# Altium schematic symbol library Regulator_Linear.SchLib: 1452 symbols (part 8 of 10) (continued)
## TCR2EE10
designator *  value TCR2EE10
ki_keywords: TOSHIBA LDO voltage regulator; ki_description: 200mA Low-dropout Voltage Regulator, Vout 1.0V, Vin up to 5.5V, SOT-553; ki_fp_filters: SOT?553*; Footprint: Package_TO_SOT_SMD:SOT-553; Supplier: https://toshiba.semicon-storage.com/info/docget.jsp?did=13794&prodName=TCR2EF45
footprint SOT-553
pins: 1 CTRL (in), 2 GND (power), 3 VIN (power), 4 VOUT (power), 5 NC (in) hidden

## TCR2EE11
designator *  value TCR2EE11
ki_keywords: TOSHIBA LDO voltage regulator; ki_description: 200mA Low-dropout Voltage Regulator, Vout 1.1V, Vin up to 5.5V, SOT-553; ki_fp_filters: SOT?553*; Footprint: Package_TO_SOT_SMD:SOT-553; Supplier: https://toshiba.semicon-storage.com/info/docget.jsp?did=13794&prodName=TCR2EF45
footprint SOT-553
pins: 1 CTRL (in), 2 GND (power), 3 VIN (power), 4 VOUT (power), 5 NC (in) hidden

## TCR2EE12
designator *  value TCR2EE12
ki_keywords: TOSHIBA LDO voltage regulator; ki_description: 200mA Low-dropout Voltage Regulator, Vout 1.2V, Vin up to 5.5V, SOT-553; ki_fp_filters: SOT?553*; Footprint: Package_TO_SOT_SMD:SOT-553; Supplier: https://toshiba.semicon-storage.com/info/docget.jsp?did=13794&prodName=TCR2EF45
footprint SOT-553
pins: 1 CTRL (in), 2 GND (power), 3 VIN (power), 4 VOUT (power), 5 NC (in) hidden

## TCR2EE13
designator *  value TCR2EE13
ki_keywords: TOSHIBA LDO voltage regulator; ki_description: 200mA Low-dropout Voltage Regulator, Vout 1.3V, Vin up to 5.5V, SOT-553; ki_fp_filters: SOT?553*; Footprint: Package_TO_SOT_SMD:SOT-553; Supplier: https://toshiba.semicon-storage.com/info/docget.jsp?did=13794&prodName=TCR2EF45
footprint SOT-553
pins: 1 CTRL (in), 2 GND (power), 3 VIN (power), 4 VOUT (power), 5 NC (in) hidden

## TCR2EE14
designator *  value TCR2EE14
ki_keywords: TOSHIBA LDO voltage regulator; ki_description: 200mA Low-dropout Voltage Regulator, Vout 1.4V, Vin up to 5.5V, SOT-553; ki_fp_filters: SOT?553*; Footprint: Package_TO_SOT_SMD:SOT-553; Supplier: https://toshiba.semicon-storage.com/info/docget.jsp?did=13794&prodName=TCR2EF45
footprint SOT-553
pins: 1 CTRL (in), 2 GND (power), 3 VIN (power), 4 VOUT (power), 5 NC (in) hidden

## TCR2EE15
designator *  value TCR2EE15
ki_keywords: TOSHIBA LDO voltage regulator; ki_description: 200mA Low-dropout Voltage Regulator, Vout 1.5V, Vin up to 5.5V, SOT-553; ki_fp_filters: SOT?553*; Footprint: Package_TO_SOT_SMD:SOT-553; Supplier: https://toshiba.semicon-storage.com/info/docget.jsp?did=13794&prodName=TCR2EF45
footprint SOT-553
pins: 1 CTRL (in), 2 GND (power), 3 VIN (power), 4 VOUT (power), 5 NC (in) hidden

## TCR2EE17
designator *  value TCR2EE17
ki_keywords: TOSHIBA LDO voltage regulator; ki_description: 200mA Low-dropout Voltage Regulator, Vout 1.7V, Vin up to 5.5V, SOT-553; ki_fp_filters: SOT?553*; Footprint: Package_TO_SOT_SMD:SOT-553; Supplier: https://toshiba.semicon-storage.com/info/docget.jsp?did=13794&prodName=TCR2EF45
footprint SOT-553
pins: 1 CTRL (in), 2 GND (power), 3 VIN (power), 4 VOUT (power), 5 NC (in) hidden

## TCR2EE18
designator *  value TCR2EE18
ki_keywords: TOSHIBA LDO voltage regulator; ki_description: 200mA Low-dropout Voltage Regulator, Vout 1.8V, Vin up to 5.5V, SOT-553; ki_fp_filters: SOT?553*; Footprint: Package_TO_SOT_SMD:SOT-553; Supplier: https://toshiba.semicon-storage.com/info/docget.jsp?did=13794&prodName=TCR2EF45
footprint SOT-553
pins: 1 CTRL (in), 2 GND (power), 3 VIN (power), 4 VOUT (power), 5 NC (in) hidden

## TCR2EE19
designator *  value TCR2EE19
ki_keywords: TOSHIBA LDO voltage regulator; ki_description: 200mA Low-dropout Voltage Regulator, Vout 1.9V, Vin up to 5.5V, SOT-553; ki_fp_filters: SOT?553*; Footprint: Package_TO_SOT_SMD:SOT-553; Supplier: https://toshiba.semicon-storage.com/info/docget.jsp?did=13794&prodName=TCR2EF45
footprint SOT-553
pins: 1 CTRL (in), 2 GND (power), 3 VIN (power), 4 VOUT (power), 5 NC (in) hidden

## TCR2EE20
designator *  value TCR2EE20
ki_keywords: TOSHIBA LDO voltage regulator; ki_description: 200mA Low-dropout Voltage Regulator, Vout 2.0V, Vin up to 5.5V, SOT-553; ki_fp_filters: SOT?553*; Footprint: Package_TO_SOT_SMD:SOT-553; Supplier: https://toshiba.semicon-storage.com/info/docget.jsp?did=13794&prodName=TCR2EF45
footprint SOT-553
pins: 1 CTRL (in), 2 GND (power), 3 VIN (power), 4 VOUT (power), 5 NC (in) hidden

## TCR2EE24
designator *  value TCR2EE24
ki_keywords: TOSHIBA LDO voltage regulator; ki_description: 200mA Low-dropout Voltage Regulator, Vout 2.4V, Vin up to 5.5V, SOT-553; ki_fp_filters: SOT?553*; Footprint: Package_TO_SOT_SMD:SOT-553; Supplier: https://toshiba.semicon-storage.com/info/docget.jsp?did=13794&prodName=TCR2EF45
footprint SOT-553
pins: 1 CTRL (in), 2 GND (power), 3 VIN (power), 4 VOUT (power), 5 NC (in) hidden

## TCR2EE25
designator *  value TCR2EE25
ki_keywords: TOSHIBA LDO voltage regulator; ki_description: 200mA Low-dropout Voltage Regulator, Vout 2.5V, Vin up to 5.5V, SOT-553; ki_fp_filters: SOT?553*; Footprint: Package_TO_SOT_SMD:SOT-553; Supplier: https://toshiba.semicon-storage.com/info/docget.jsp?did=13794&prodName=TCR2EF45
footprint SOT-553
pins: 1 CTRL (in), 2 GND (power), 3 VIN (power), 4 VOUT (power), 5 NC (in) hidden

## TCR2EE27
designator *  value TCR2EE27
ki_keywords: TOSHIBA LDO voltage regulator; ki_description: 200mA Low-dropout Voltage Regulator, Vout 2.7V, Vin up to 5.5V, SOT-553; ki_fp_filters: SOT?553*; Footprint: Package_TO_SOT_SMD:SOT-553; Supplier: https://toshiba.semicon-storage.com/info/docget.jsp?did=13794&prodName=TCR2EF45
footprint SOT-553
pins: 1 CTRL (in), 2 GND (power), 3 VIN (power), 4 VOUT (power), 5 NC (in) hidden

## TCR2EE105
designator *  value TCR2EE105
ki_keywords: TOSHIBA LDO voltage regulator; ki_description: 200mA Low-dropout Voltage Regulator, Vout 1.05V, Vin up to 5.5V, SOT-553; ki_fp_filters: SOT?553*; Footprint: Package_TO_SOT_SMD:SOT-553; Supplier: https://toshiba.semicon-storage.com/info/docget.jsp?did=13794&prodName=TCR2EF45
footprint SOT-553
pins: 1 CTRL (in), 2 GND (power), 3 VIN (power), 4 VOUT (power), 5 NC (in) hidden

## TCR2EE115
designator *  value TCR2EE115
ki_keywords: TOSHIBA LDO voltage regulator; ki_description: 200mA Low-dropout Voltage Regulator, Vout 1.15V, Vin up to 5.5V, SOT-553; ki_fp_filters: SOT?553*; Footprint: Package_TO_SOT_SMD:SOT-553; Supplier: https://toshiba.semicon-storage.com/info/docget.jsp?did=13794&prodName=TCR2EF45
footprint SOT-553
pins: 1 CTRL (in), 2 GND (power), 3 VIN (power), 4 VOUT (power), 5 NC (in) hidden

## TCR2EE125
designator *  value TCR2EE125
ki_keywords: TOSHIBA LDO voltage regulator; ki_description: 200mA Low-dropout Voltage Regulator, Vout 1.25V, Vin up to 5.5V, SOT-553; ki_fp_filters: SOT?553*; Footprint: Package_TO_SOT_SMD:SOT-553; Supplier: https://toshiba.semicon-storage.com/info/docget.jsp?did=13794&prodName=TCR2EF45
footprint SOT-553
pins: 1 CTRL (in), 2 GND (power), 3 VIN (power), 4 VOUT (power), 5 NC (in) hidden

## TCR2EE135
designator *  value TCR2EE135
ki_keywords: TOSHIBA LDO voltage regulator; ki_description: 200mA Low-dropout Voltage Regulator, Vout 1.35V, Vin up to 5.5V, SOT-553; ki_fp_filters: SOT?553*; Footprint: Package_TO_SOT_SMD:SOT-553; Supplier: https://toshiba.semicon-storage.com/info/docget.jsp?did=13794&prodName=TCR2EF45
footprint SOT-553
pins: 1 CTRL (in), 2 GND (power), 3 VIN (power), 4 VOUT (power), 5 NC (in) hidden

## TCR2EE145
designator *  value TCR2EE145
ki_keywords: TOSHIBA LDO voltage regulator; ki_description: 200mA Low-dropout Voltage Regulator, Vout 1.45V, Vin up to 5.5V, SOT-553; ki_fp_filters: SOT?553*; Footprint: Package_TO_SOT_SMD:SOT-553; Supplier: https://toshiba.semicon-storage.com/info/docget.jsp?did=13794&prodName=TCR2EF45
footprint SOT-553
pins: 1 CTRL (in), 2 GND (power), 3 VIN (power), 4 VOUT (power), 5 NC (in) hidden

## TCR2EE185
designator *  value TCR2EE185
ki_keywords: TOSHIBA LDO voltage regulator; ki_description: 200mA Low-dropout Voltage Regulator, Vout 1.85V, Vin up to 5.5V, SOT-553; ki_fp_filters: SOT?553*; Footprint: Package_TO_SOT_SMD:SOT-553; Supplier: https://toshiba.semicon-storage.com/info/docget.jsp?did=13794&prodName=TCR2EF45
footprint SOT-553
pins: 1 CTRL (in), 2 GND (power), 3 VIN (power), 4 VOUT (power), 5 NC (in) hidden

## TCR2EE275
designator *  value TCR2EE275
ki_keywords: TOSHIBA LDO voltage regulator; ki_description: 200mA Low-dropout Voltage Regulator, Vout 2.75V, Vin up to 5.5V, SOT-553; ki_fp_filters: SOT?553*; Footprint: Package_TO_SOT_SMD:SOT-553; Supplier: https://toshiba.semicon-storage.com/info/docget.jsp?did=13794&prodName=TCR2EF45
footprint SOT-553
pins: 1 CTRL (in), 2 GND (power), 3 VIN (power), 4 VOUT (power), 5 NC (in) hidden

## TLV1117-15
designator *  value TLV1117-15
ki_keywords: linear regulator ldo fixed positive; ki_description: 800mA Low-Dropout Linear Regulator, 1.5V fixed output, TO-220/TO-252/TO-263/SOT-223; ki_fp_filters: SOT?223* TO?263* TO?252* TO?220*; Supplier: http://www.ti.com/lit/ds/symlink/tlv1117.pdf
pins: 1 GND (power), 2 VO (power), 3 VI (power)

## TLV1117-18
designator *  value TLV1117-18
ki_keywords: linear regulator ldo fixed positive; ki_description: 800mA Low-Dropout Linear Regulator, 1.8V fixed output, TO-220/TO-252/TO-263/SOT-223; ki_fp_filters: SOT?223* TO?263* TO?252* TO?220*; Supplier: http://www.ti.com/lit/ds/symlink/tlv1117.pdf
pins: 1 GND (power), 2 VO (power), 3 VI (power)

## TLV1117-25
designator *  value TLV1117-25
ki_keywords: linear regulator ldo fixed positive; ki_description: 800mA Low-Dropout Linear Regulator, 2.5V fixed output, TO-220/TO-252/TO-263/SOT-223; ki_fp_filters: SOT?223* TO?263* TO?252* TO?220*; Supplier: http://www.ti.com/lit/ds/symlink/tlv1117.pdf
pins: 1 GND (power), 2 VO (power), 3 VI (power)

## TLV1117-33
designator *  value TLV1117-33
ki_keywords: linear regulator ldo fixed positive; ki_description: 800mA Low-Dropout Linear Regulator, 3.3V fixed output, TO-220/TO-252/TO-263/SOT-223; ki_fp_filters: SOT?223* TO?263* TO?252* TO?220*; Supplier: http://www.ti.com/lit/ds/symlink/tlv1117.pdf
pins: 1 GND (power), 2 VO (power), 3 VI (power)

## TLV1117-50
designator *  value TLV1117-50
ki_keywords: linear regulator ldo fixed positive; ki_description: 800mA Low-Dropout Linear Regulator, 5.0V fixed output, TO-220/TO-252/TO-263/SOT-223; ki_fp_filters: SOT?223* TO?263* TO?252* TO?220*; Supplier: http://www.ti.com/lit/ds/symlink/tlv1117.pdf
pins: 1 GND (power), 2 VO (power), 3 VI (power)

## TLV1117-ADJ
designator *  value TLV1117-ADJ
ki_keywords: linear regulator ldo adjustable positive; ki_description: 800mA Low-Dropout Linear Regulator, adjustable output, TO-220/TO-252/TO-263/SOT-223; ki_fp_filters: SOT?223* TO?263* TO?252* TO?220*; Supplier: http://www.ti.com/lit/ds/symlink/tlv1117.pdf
pins: 1 ADJ (in), 2 VO (power), 3 VI (power)

## TLV70012_SOT23-5
designator *  value TLV70012_SOT23-5
ki_keywords: 200mA LDO Regulator Fixed Positive; ki_description: 200mA Low Dropout Voltage Regulator, Fixed Output 1.2V, SOT-23-5; ki_fp_filters: SOT?23*; Footprint: Package_TO_SOT_SMD:SOT-23-5; Supplier: http://www.ti.com/lit/ds/symlink/tlv700.pdf
footprint SOT-23-5
pins: 1 IN (power), 2 GND (power), 3 EN (in), 4 NC (in) hidden, 5 OUT (power)

## TLV70012_SOT353
designator *  value TLV70012_SOT353
ki_keywords: 200mA LDO Regulator Fixed Positive; ki_description: 200mA Low Dropout Voltage Regulator, Fixed Output 1.2V, SOT-23-5/SC-70-5/SOT-353; ki_fp_filters: SOT*353*; Footprint: Package_TO_SOT_SMD:SOT-353_SC-70-5; Supplier: http://www.ti.com/lit/ds/symlink/tlv700.pdf
footprint SOT-353_SC-70-5
pins: 1 IN (power), 2 GND (power), 3 EN (in), 4 NC (in) hidden, 5 OUT (power)

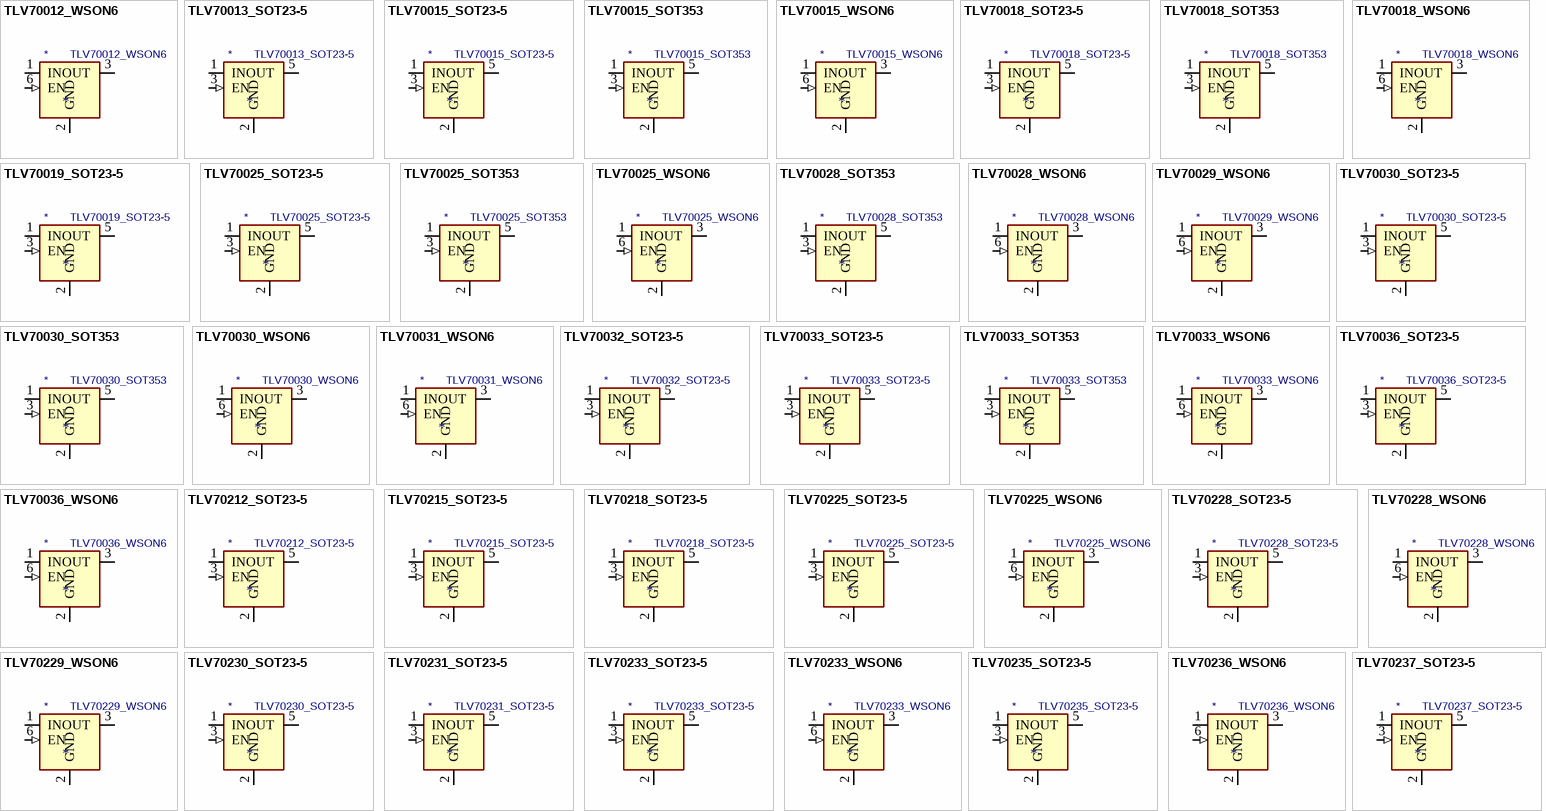
[diagram p30: symbols TLV70012_WSON6 to TLV70237_SOT23-5]

## TLV70012_WSON6
designator *  value TLV70012_WSON6
ki_keywords: 200mA LDO Regulator Fixed Positive; ki_description: 200mA Low Dropout Voltage Regulator, Fixed Output 1.2V, WSON6; ki_fp_filters: WSON*; Footprint: Package_SON:WSON-6_1.5x1.5mm_P0.5mm; Supplier: http://www.ti.com/lit/ds/symlink/tlv700.pdf
footprint WSON-6_1.5x1.5mm_P0.5mm
pins: 1 IN (power), 2 GND (power), 3 OUT (power), 4 NC (in) hidden, 5 NC (in) hidden, 6 EN (in)

## TLV70013_SOT23-5
designator *  value TLV70013_SOT23-5
ki_keywords: 200mA LDO Regulator Fixed Positive; ki_description: 200mA Low Dropout Voltage Regulator, Fixed Output 1.3V, SOT-23-5; ki_fp_filters: SOT?23*; Footprint: Package_TO_SOT_SMD:SOT-23-5; Supplier: http://www.ti.com/lit/ds/symlink/tlv700.pdf
footprint SOT-23-5
pins: 1 IN (power), 2 GND (power), 3 EN (in), 4 NC (in) hidden, 5 OUT (power)

## TLV70015_SOT23-5
designator *  value TLV70015_SOT23-5
ki_keywords: 200mA LDO Regulator Fixed Positive; ki_description: 200mA Low Dropout Voltage Regulator, Fixed Output 1.5V, SOT-23-5; ki_fp_filters: SOT?23*; Footprint: Package_TO_SOT_SMD:SOT-23-5; Supplier: http://www.ti.com/lit/ds/symlink/tlv700.pdf
footprint SOT-23-5
pins: 1 IN (power), 2 GND (power), 3 EN (in), 4 NC (in) hidden, 5 OUT (power)

## TLV70015_SOT353
designator *  value TLV70015_SOT353
ki_keywords: 200mA LDO Regulator Fixed Positive; ki_description: 200mA Low Dropout Voltage Regulator, Fixed Output 1.5V, SOT-23-5/SC-70-5/SOT-353; ki_fp_filters: SOT*353*; Footprint: Package_TO_SOT_SMD:SOT-353_SC-70-5; Supplier: http://www.ti.com/lit/ds/symlink/tlv700.pdf
footprint SOT-353_SC-70-5
pins: 1 IN (power), 2 GND (power), 3 EN (in), 4 NC (in) hidden, 5 OUT (power)

## TLV70015_WSON6
designator *  value TLV70015_WSON6
ki_keywords: 200mA LDO Regulator Fixed Positive; ki_description: 200mA Low Dropout Voltage Regulator, Fixed Output 1.5V, WSON6; ki_fp_filters: WSON*; Footprint: Package_SON:WSON-6_1.5x1.5mm_P0.5mm; Supplier: http://www.ti.com/lit/ds/symlink/tlv700.pdf
footprint WSON-6_1.5x1.5mm_P0.5mm
pins: 1 IN (power), 2 GND (power), 3 OUT (power), 4 NC (in) hidden, 5 NC (in) hidden, 6 EN (in)

## TLV70018_SOT23-5
designator *  value TLV70018_SOT23-5
ki_keywords: 200mA LDO Regulator Fixed Positive; ki_description: 200mA Low Dropout Voltage Regulator, Fixed Output 1.8V, SOT-23-5; ki_fp_filters: SOT?23*; Footprint: Package_TO_SOT_SMD:SOT-23-5; Supplier: http://www.ti.com/lit/ds/symlink/tlv700.pdf
footprint SOT-23-5
pins: 1 IN (power), 2 GND (power), 3 EN (in), 4 NC (in) hidden, 5 OUT (power)

## TLV70018_SOT353
designator *  value TLV70018_SOT353
ki_keywords: 200mA LDO Regulator Fixed Positive; ki_description: 200mA Low Dropout Voltage Regulator, Fixed Output 1.8V, SC70-5; ki_fp_filters: SOT*353*; Footprint: Package_TO_SOT_SMD:SOT-353_SC-70-5; Supplier: http://www.ti.com/lit/ds/symlink/tlv700.pdf
footprint SOT-353_SC-70-5
pins: 1 IN (power), 2 GND (power), 3 EN (in), 4 NC (in) hidden, 5 OUT (power)

## TLV70018_WSON6
designator *  value TLV70018_WSON6
ki_keywords: 200mA LDO Regulator Fixed Positive; ki_description: 200mA Low Dropout Voltage Regulator, Fixed Output 1.8V, WSON6; ki_fp_filters: WSON*; Footprint: Package_SON:WSON-6_1.5x1.5mm_P0.5mm; Supplier: http://www.ti.com/lit/ds/symlink/tlv700.pdf
footprint WSON-6_1.5x1.5mm_P0.5mm
pins: 1 IN (power), 2 GND (power), 3 OUT (power), 4 NC (in) hidden, 5 NC (in) hidden, 6 EN (in)

## TLV70019_SOT23-5
designator *  value TLV70019_SOT23-5
ki_keywords: 200mA LDO Regulator Fixed Positive; ki_description: 200mA Low Dropout Voltage Regulator, Fixed Output 1.9V, SOT-23-5; ki_fp_filters: SOT?23*; Footprint: Package_TO_SOT_SMD:SOT-23-5; Supplier: http://www.ti.com/lit/ds/symlink/tlv700.pdf
footprint SOT-23-5
pins: 1 IN (power), 2 GND (power), 3 EN (in), 4 NC (in) hidden, 5 OUT (power)

## TLV70025_SOT23-5
designator *  value TLV70025_SOT23-5
ki_keywords: 200mA LDO Regulator Fixed Positive; ki_description: 200mA Low Dropout Voltage Regulator, Fixed Output 2.5V, SOT-23-5; ki_fp_filters: SOT?23*; Footprint: Package_TO_SOT_SMD:SOT-23-5; Supplier: http://www.ti.com/lit/ds/symlink/tlv700.pdf
footprint SOT-23-5
pins: 1 IN (power), 2 GND (power), 3 EN (in), 4 NC (in) hidden, 5 OUT (power)

## TLV70025_SOT353
designator *  value TLV70025_SOT353
ki_keywords: 200mA LDO Regulator Fixed Positive; ki_description: 200mA Low Dropout Voltage Regulator, Fixed Output 2.5V, SC70-5; ki_fp_filters: SOT*353*; Footprint: Package_TO_SOT_SMD:SOT-353_SC-70-5; Supplier: http://www.ti.com/lit/ds/symlink/tlv700.pdf
footprint SOT-353_SC-70-5
pins: 1 IN (power), 2 GND (power), 3 EN (in), 4 NC (in) hidden, 5 OUT (power)

## TLV70025_WSON6
designator *  value TLV70025_WSON6
ki_keywords: 200mA LDO Regulator Fixed Positive; ki_description: 200mA Low Dropout Voltage Regulator, Fixed Output 2.5V, WSON6; ki_fp_filters: WSON*; Footprint: Package_SON:WSON-6_1.5x1.5mm_P0.5mm; Supplier: http://www.ti.com/lit/ds/symlink/tlv700.pdf
footprint WSON-6_1.5x1.5mm_P0.5mm
pins: 1 IN (power), 2 GND (power), 3 OUT (power), 4 NC (in) hidden, 5 NC (in) hidden, 6 EN (in)

## TLV70028_SOT353
designator *  value TLV70028_SOT353
ki_keywords: 200mA LDO Regulator Fixed Positive; ki_description: 200mA Low Dropout Voltage Regulator, Fixed Output 2.8V, SC70-5; ki_fp_filters: SOT*353*; Footprint: Package_TO_SOT_SMD:SOT-353_SC-70-5; Supplier: http://www.ti.com/lit/ds/symlink/tlv700.pdf
footprint SOT-353_SC-70-5
pins: 1 IN (power), 2 GND (power), 3 EN (in), 4 NC (in) hidden, 5 OUT (power)

## TLV70028_WSON6
designator *  value TLV70028_WSON6
ki_keywords: 200mA LDO Regulator Fixed Positive; ki_description: 200mA Low Dropout Voltage Regulator, Fixed Output 2.8V, WSON6; ki_fp_filters: WSON*; Footprint: Package_SON:WSON-6_1.5x1.5mm_P0.5mm; Supplier: http://www.ti.com/lit/ds/symlink/tlv700.pdf
footprint WSON-6_1.5x1.5mm_P0.5mm
pins: 1 IN (power), 2 GND (power), 3 OUT (power), 4 NC (in) hidden, 5 NC (in) hidden, 6 EN (in)

## TLV70029_WSON6
designator *  value TLV70029_WSON6
ki_keywords: 200mA LDO Regulator Fixed Positive; ki_description: 200mA Low Dropout Voltage Regulator, Fixed Output 2.9V, WSON6; ki_fp_filters: WSON*; Footprint: Package_SON:WSON-6_1.5x1.5mm_P0.5mm; Supplier: http://www.ti.com/lit/ds/symlink/tlv700.pdf
footprint WSON-6_1.5x1.5mm_P0.5mm
pins: 1 IN (power), 2 GND (power), 3 OUT (power), 4 NC (in) hidden, 5 NC (in) hidden, 6 EN (in)

## TLV70030_SOT23-5
designator *  value TLV70030_SOT23-5
ki_keywords: 200mA LDO Regulator Fixed Positive; ki_description: 200mA Low Dropout Voltage Regulator, Fixed Output 3.0V, SOT-23-5; ki_fp_filters: SOT?23*; Footprint: Package_TO_SOT_SMD:SOT-23-5; Supplier: http://www.ti.com/lit/ds/symlink/tlv700.pdf
footprint SOT-23-5
pins: 1 IN (power), 2 GND (power), 3 EN (in), 4 NC (in) hidden, 5 OUT (power)

## TLV70030_SOT353
designator *  value TLV70030_SOT353
ki_keywords: 200mA LDO Regulator Fixed Positive; ki_description: 200mA Low Dropout Voltage Regulator, Fixed Output 3V, SC70-5; ki_fp_filters: SOT*353*; Footprint: Package_TO_SOT_SMD:SOT-353_SC-70-5; Supplier: http://www.ti.com/lit/ds/symlink/tlv700.pdf
footprint SOT-353_SC-70-5
pins: 1 IN (power), 2 GND (power), 3 EN (in), 4 NC (in) hidden, 5 OUT (power)

## TLV70030_WSON6
designator *  value TLV70030_WSON6
ki_keywords: 200mA LDO Regulator Fixed Positive; ki_description: 200mA Low Dropout Voltage Regulator, Fixed Output 3V, WSON6; ki_fp_filters: WSON*; Footprint: Package_SON:WSON-6_1.5x1.5mm_P0.5mm; Supplier: http://www.ti.com/lit/ds/symlink/tlv700.pdf
footprint WSON-6_1.5x1.5mm_P0.5mm
pins: 1 IN (power), 2 GND (power), 3 OUT (power), 4 NC (in) hidden, 5 NC (in) hidden, 6 EN (in)

## TLV70031_WSON6
designator *  value TLV70031_WSON6
ki_keywords: 200mA LDO Regulator Fixed Positive; ki_description: 200mA Low Dropout Voltage Regulator, Fixed Output 3.1V, WSON6; ki_fp_filters: WSON*; Footprint: Package_SON:WSON-6_1.5x1.5mm_P0.5mm; Supplier: http://www.ti.com/lit/ds/symlink/tlv700.pdf
footprint WSON-6_1.5x1.5mm_P0.5mm
pins: 1 IN (power), 2 GND (power), 3 OUT (power), 4 NC (in) hidden, 5 NC (in) hidden, 6 EN (in)

## TLV70032_SOT23-5
designator *  value TLV70032_SOT23-5
ki_keywords: 200mA LDO Regulator Fixed Positive; ki_description: 200mA Low Dropout Voltage Regulator, Fixed Output 3.2V, SOT-23-5; ki_fp_filters: SOT?23*; Footprint: Package_TO_SOT_SMD:SOT-23-5; Supplier: http://www.ti.com/lit/ds/symlink/tlv700.pdf
footprint SOT-23-5
pins: 1 IN (power), 2 GND (power), 3 EN (in), 4 NC (in) hidden, 5 OUT (power)

## TLV70033_SOT23-5
designator *  value TLV70033_SOT23-5
ki_keywords: 200mA LDO Regulator Fixed Positive; ki_description: 200mA Low Dropout Voltage Regulator, Fixed Output 3.3V, SOT-23-5; ki_fp_filters: SOT?23*; Footprint: Package_TO_SOT_SMD:SOT-23-5; Supplier: http://www.ti.com/lit/ds/symlink/tlv700.pdf
footprint SOT-23-5
pins: 1 IN (power), 2 GND (power), 3 EN (in), 4 NC (in) hidden, 5 OUT (power)

## TLV70033_SOT353
designator *  value TLV70033_SOT353
ki_keywords: 200mA LDO Regulator Fixed Positive; ki_description: 200mA Low Dropout Voltage Regulator, Fixed Output 3.3V, SC70-5; ki_fp_filters: SOT*353*; Footprint: Package_TO_SOT_SMD:SOT-353_SC-70-5; Supplier: http://www.ti.com/lit/ds/symlink/tlv700.pdf
footprint SOT-353_SC-70-5
pins: 1 IN (power), 2 GND (power), 3 EN (in), 4 NC (in) hidden, 5 OUT (power)

## TLV70033_WSON6
designator *  value TLV70033_WSON6
ki_keywords: 200mA LDO Regulator Fixed Positive; ki_description: 200mA Low Dropout Voltage Regulator, Fixed Output 3.3V, WSON6; ki_fp_filters: WSON*; Footprint: Package_SON:WSON-6_1.5x1.5mm_P0.5mm; Supplier: http://www.ti.com/lit/ds/symlink/tlv700.pdf
footprint WSON-6_1.5x1.5mm_P0.5mm
pins: 1 IN (power), 2 GND (power), 3 OUT (power), 4 NC (in) hidden, 5 NC (in) hidden, 6 EN (in)

## TLV70036_SOT23-5
designator *  value TLV70036_SOT23-5
ki_keywords: 200mA LDO Regulator Fixed Positive; ki_description: 200mA Low Dropout Voltage Regulator, Fixed Output 3.6V, SOT-23-5; ki_fp_filters: SOT?23*; Footprint: Package_TO_SOT_SMD:SOT-23-5; Supplier: http://www.ti.com/lit/ds/symlink/tlv700.pdf
footprint SOT-23-5
pins: 1 IN (power), 2 GND (power), 3 EN (in), 4 NC (in) hidden, 5 OUT (power)

## TLV70036_WSON6
designator *  value TLV70036_WSON6
ki_keywords: 200mA LDO Regulator Fixed Positive; ki_description: 200mA Low Dropout Voltage Regulator, Fixed Output 3.6V, WSON6; ki_fp_filters: WSON*; Footprint: Package_SON:WSON-6_1.5x1.5mm_P0.5mm; Supplier: http://www.ti.com/lit/ds/symlink/tlv700.pdf
footprint WSON-6_1.5x1.5mm_P0.5mm
pins: 1 IN (power), 2 GND (power), 3 OUT (power), 4 NC (in) hidden, 5 NC (in) hidden, 6 EN (in)

## TLV70212_SOT23-5
designator *  value TLV70212_SOT23-5
ki_keywords: 300mA LDO Regulator Fixed Positive; ki_description: 300mA Low Dropout Voltage Regulator, Fixed Output 1.2V, SOT-23-5; ki_fp_filters: SOT?23*; Footprint: Package_TO_SOT_SMD:SOT-23-5; Supplier: http://www.ti.com/lit/ds/symlink/tlv702.pdf
footprint SOT-23-5
pins: 1 IN (power), 2 GND (power), 3 EN (in), 4 NC (in) hidden, 5 OUT (power)

## TLV70215_SOT23-5
designator *  value TLV70215_SOT23-5
ki_keywords: 300mA LDO Regulator Fixed Positive; ki_description: 300mA Low Dropout Voltage Regulator, Fixed Output 1.5V, SOT-23-5; ki_fp_filters: SOT?23*; Footprint: Package_TO_SOT_SMD:SOT-23-5; Supplier: http://www.ti.com/lit/ds/symlink/tlv702.pdf
footprint SOT-23-5
pins: 1 IN (power), 2 GND (power), 3 EN (in), 4 NC (in) hidden, 5 OUT (power)

## TLV70218_SOT23-5
designator *  value TLV70218_SOT23-5
ki_keywords: 300mA LDO Regulator Fixed Positive; ki_description: 300mA Low Dropout Voltage Regulator, Fixed Output 1.8V, SOT-23-5; ki_fp_filters: SOT?23*; Footprint: Package_TO_SOT_SMD:SOT-23-5; Supplier: http://www.ti.com/lit/ds/symlink/tlv702.pdf
footprint SOT-23-5
pins: 1 IN (power), 2 GND (power), 3 EN (in), 4 NC (in) hidden, 5 OUT (power)

## TLV70225_SOT23-5
designator *  value TLV70225_SOT23-5
ki_keywords: 300mA LDO Regulator Fixed Positive; ki_description: 300mA Low Dropout Voltage Regulator, Fixed Output 2.5V, SOT-23-5; ki_fp_filters: SOT?23*; Footprint: Package_TO_SOT_SMD:SOT-23-5; Supplier: http://www.ti.com/lit/ds/symlink/tlv702.pdf
footprint SOT-23-5
pins: 1 IN (power), 2 GND (power), 3 EN (in), 4 NC (in) hidden, 5 OUT (power)

## TLV70225_WSON6
designator *  value TLV70225_WSON6
ki_keywords: 300mA LDO Regulator Fixed Positive; ki_description: 300mA Low Dropout Voltage Regulator, Fixed Output 2.5V, WSON6; ki_fp_filters: WSON*; Footprint: Package_SON:WSON-6_1.5x1.5mm_P0.5mm; Supplier: http://www.ti.com/lit/ds/symlink/tlv702.pdf
footprint WSON-6_1.5x1.5mm_P0.5mm
pins: 1 IN (power), 2 GND (power), 3 OUT (power), 4 NC (in) hidden, 5 NC (in) hidden, 6 EN (in)

## TLV70228_SOT23-5
designator *  value TLV70228_SOT23-5
ki_keywords: 300mA LDO Regulator Fixed Positive; ki_description: 300mA Low Dropout Voltage Regulator, Fixed Output 2.8V, SOT-23-5; ki_fp_filters: SOT?23*; Footprint: Package_TO_SOT_SMD:SOT-23-5; Supplier: http://www.ti.com/lit/ds/symlink/tlv702.pdf
footprint SOT-23-5
pins: 1 IN (power), 2 GND (power), 3 EN (in), 4 NC (in) hidden, 5 OUT (power)

## TLV70228_WSON6
designator *  value TLV70228_WSON6
ki_keywords: 300mA LDO Regulator Fixed Positive; ki_description: 300mA Low Dropout Voltage Regulator, Fixed Output 2.8V, WSON6; ki_fp_filters: WSON*; Footprint: Package_SON:WSON-6_1.5x1.5mm_P0.5mm; Supplier: http://www.ti.com/lit/ds/symlink/tlv702.pdf
footprint WSON-6_1.5x1.5mm_P0.5mm
pins: 1 IN (power), 2 GND (power), 3 OUT (power), 4 NC (in) hidden, 5 NC (in) hidden, 6 EN (in)

## TLV70229_WSON6
designator *  value TLV70229_WSON6
ki_keywords: 300mA LDO Regulator Fixed Positive; ki_description: 300mA Low Dropout Voltage Regulator, Fixed Output 2.9V, WSON6; ki_fp_filters: WSON*; Footprint: Package_SON:WSON-6_1.5x1.5mm_P0.5mm; Supplier: http://www.ti.com/lit/ds/symlink/tlv702.pdf
footprint WSON-6_1.5x1.5mm_P0.5mm
pins: 1 IN (power), 2 GND (power), 3 OUT (power), 4 NC (in) hidden, 5 NC (in) hidden, 6 EN (in)

## TLV70230_SOT23-5
designator *  value TLV70230_SOT23-5
ki_keywords: 300mA LDO Regulator Fixed Positive; ki_description: 300mA Low Dropout Voltage Regulator, Fixed Output 3V, SOT-23-5; ki_fp_filters: SOT?23*; Footprint: Package_TO_SOT_SMD:SOT-23-5; Supplier: http://www.ti.com/lit/ds/symlink/tlv702.pdf
footprint SOT-23-5
pins: 1 IN (power), 2 GND (power), 3 EN (in), 4 NC (in) hidden, 5 OUT (power)

## TLV70231_SOT23-5
designator *  value TLV70231_SOT23-5
ki_keywords: 300mA LDO Regulator Fixed Positive; ki_description: 300mA Low Dropout Voltage Regulator, Fixed Output 3.1V, SOT-23-5; ki_fp_filters: SOT?23*; Footprint: Package_TO_SOT_SMD:SOT-23-5; Supplier: http://www.ti.com/lit/ds/symlink/tlv702.pdf
footprint SOT-23-5
pins: 1 IN (power), 2 GND (power), 3 EN (in), 4 NC (in) hidden, 5 OUT (power)

## TLV70233_SOT23-5
designator *  value TLV70233_SOT23-5
ki_keywords: 300mA LDO Regulator Fixed Positive; ki_description: 300mA Low Dropout Voltage Regulator, Fixed Output 3.3V, SOT-23-5; ki_fp_filters: SOT?23*; Footprint: Package_TO_SOT_SMD:SOT-23-5; Supplier: http://www.ti.com/lit/ds/symlink/tlv702.pdf
footprint SOT-23-5
pins: 1 IN (power), 2 GND (power), 3 EN (in), 4 NC (in) hidden, 5 OUT (power)

## TLV70233_WSON6
designator *  value TLV70233_WSON6
ki_keywords: 300mA LDO Regulator Fixed Positive; ki_description: 300mA Low Dropout Voltage Regulator, Fixed Output 3.3V, WSON6; ki_fp_filters: WSON*; Footprint: Package_SON:WSON-6_1.5x1.5mm_P0.5mm; Supplier: http://www.ti.com/lit/ds/symlink/tlv702.pdf
footprint WSON-6_1.5x1.5mm_P0.5mm
pins: 1 IN (power), 2 GND (power), 3 OUT (power), 4 NC (in) hidden, 5 NC (in) hidden, 6 EN (in)

## TLV70235_SOT23-5
designator *  value TLV70235_SOT23-5
ki_keywords: 300mA LDO Regulator Fixed Positive; ki_description: 300mA Low Dropout Voltage Regulator, Fixed Output 3.5V, SOT-23-5; ki_fp_filters: SOT?23*; Footprint: Package_TO_SOT_SMD:SOT-23-5; Supplier: http://www.ti.com/lit/ds/symlink/tlv702.pdf
footprint SOT-23-5
pins: 1 IN (power), 2 GND (power), 3 EN (in), 4 NC (in) hidden, 5 OUT (power)

## TLV70236_WSON6
designator *  value TLV70236_WSON6
ki_keywords: 300mA LDO Regulator Fixed Positive; ki_description: 300mA Low Dropout Voltage Regulator, Fixed Output 3.6V, WSON6; ki_fp_filters: WSON*; Footprint: Package_SON:WSON-6_1.5x1.5mm_P0.5mm; Supplier: http://www.ti.com/lit/ds/symlink/tlv702.pdf
footprint WSON-6_1.5x1.5mm_P0.5mm
pins: 1 IN (power), 2 GND (power), 3 OUT (power), 4 NC (in) hidden, 5 NC (in) hidden, 6 EN (in)

## TLV70237_SOT23-5
designator *  value TLV70237_SOT23-5
ki_keywords: 300mA LDO Regulator Fixed Positive; ki_description: 300mA Low Dropout Voltage Regulator, Fixed Output 3.7V, SOT-23-5; ki_fp_filters: SOT?23*; Footprint: Package_TO_SOT_SMD:SOT-23-5; Supplier: http://www.ti.com/lit/ds/symlink/tlv702.pdf
footprint SOT-23-5
pins: 1 IN (power), 2 GND (power), 3 EN (in), 4 NC (in) hidden, 5 OUT (power)

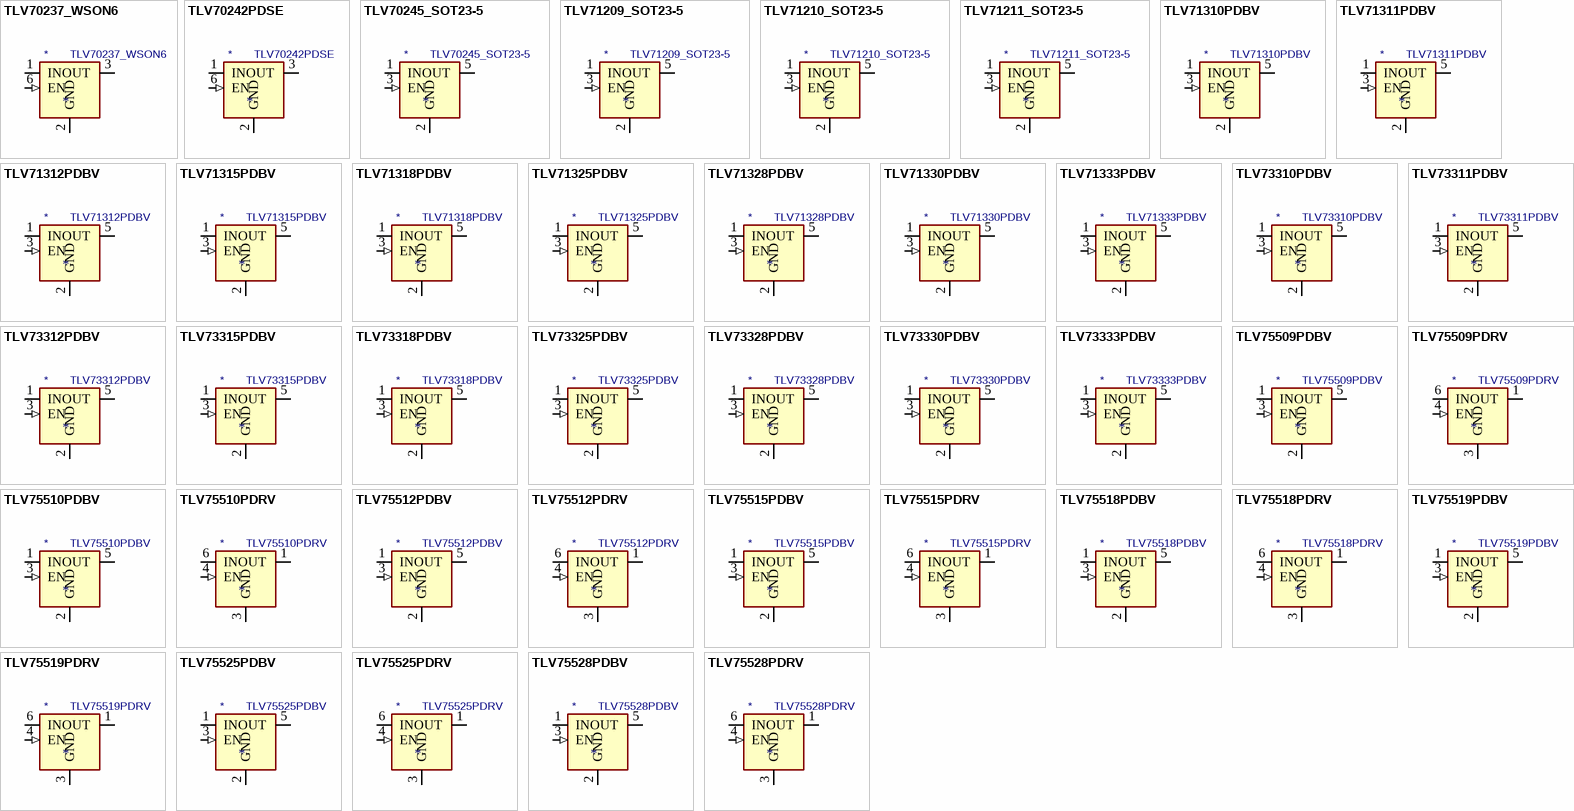
[diagram p31: symbols TLV70237_WSON6 to TLV75528PDRV]

## TLV70237_WSON6
designator *  value TLV70237_WSON6
ki_keywords: 300mA LDO Regulator Fixed Positive; ki_description: 300mA Low Dropout Voltage Regulator, Fixed Output 3.7V, WSON6; ki_fp_filters: WSON*; Footprint: Package_SON:WSON-6_1.5x1.5mm_P0.5mm; Supplier: http://www.ti.com/lit/ds/symlink/tlv702.pdf
footprint WSON-6_1.5x1.5mm_P0.5mm
pins: 1 IN (power), 2 GND (power), 3 OUT (power), 4 NC (in) hidden, 5 NC (in) hidden, 6 EN (in)

## TLV70242PDSE
designator *  value TLV70242PDSE
ki_keywords: 300mA LDO Regulator Fixed Positive; ki_description: 300mA Low Dropout Voltage Regulator, Fixed Output 4.2V, WSON6; ki_fp_filters: WSON*; Footprint: Package_SON:WSON-6_1.5x1.5mm_P0.5mm; Supplier: http://www.ti.com/lit/ds/symlink/tlv702.pdf
footprint WSON-6_1.5x1.5mm_P0.5mm
pins: 1 IN (power), 2 GND (power), 3 OUT (power), 4 NC (in) hidden, 5 NC (in) hidden, 6 EN (in)

## TLV70245_SOT23-5
designator *  value TLV70245_SOT23-5
ki_keywords: 300mA LDO Regulator Fixed Positive; ki_description: 300mA Low Dropout Voltage Regulator, Fixed Output 4.5V, SOT-23-5; ki_fp_filters: SOT?23*; Footprint: Package_TO_SOT_SMD:SOT-23-5; Supplier: http://www.ti.com/lit/ds/symlink/tlv702.pdf
footprint SOT-23-5
pins: 1 IN (power), 2 GND (power), 3 EN (in), 4 NC (in) hidden, 5 OUT (power)

## TLV71209_SOT23-5
designator *  value TLV71209_SOT23-5
ki_keywords: LDO Regulator Fixed Positive; ki_description: 300mA Low Dropout Voltage Regulator, Fixed Output 0.9V, SOT-23-5; ki_fp_filters: SOT?23*; Footprint: Package_TO_SOT_SMD:SOT-23-5; Supplier: http://www.ti.com/lit/ds/symlink/tlv712.pdf
footprint SOT-23-5
pins: 1 IN (power), 2 GND (power), 3 EN (in), 4 NC (in) hidden, 5 OUT (power)

## TLV71210_SOT23-5
designator *  value TLV71210_SOT23-5
ki_keywords: 300mA LDO Regulator Fixed Positive; ki_description: 300mA Low Dropout Voltage Regulator, Fixed Output 1.0V, SOT-23-5; ki_fp_filters: SOT?23*; Footprint: Package_TO_SOT_SMD:SOT-23-5; Supplier: http://www.ti.com/lit/ds/symlink/tlv712.pdf
footprint SOT-23-5
pins: 1 IN (power), 2 GND (power), 3 EN (in), 4 NC (in) hidden, 5 OUT (power)

## TLV71211_SOT23-5
designator *  value TLV71211_SOT23-5
ki_keywords: 300mA LDO Regulator Fixed Positive; ki_description: 300mA Low Dropout Voltage Regulator, Fixed Output 1.1V, SOT-23-5; ki_fp_filters: SOT?23*; Footprint: Package_TO_SOT_SMD:SOT-23-5; Supplier: http://www.ti.com/lit/ds/symlink/tlv712.pdf
footprint SOT-23-5
pins: 1 IN (power), 2 GND (power), 3 EN (in), 4 NC (in) hidden, 5 OUT (power)

## TLV71310PDBV
designator *  value TLV71310PDBV
ki_keywords: LDO Regulator Fixed Positive; ki_description: 150mA Low Dropout Voltage Regulator, Fixed Output 1.0V, SOT-23-5; ki_fp_filters: SOT?23*; Footprint: Package_TO_SOT_SMD:SOT-23-5; Supplier: http://www.ti.com/lit/ds/symlink/tlv713p.pdf
footprint SOT-23-5
pins: 1 IN (power), 2 GND (power), 3 EN (in), 4 NC (in) hidden, 5 OUT (power)

## TLV71311PDBV
designator *  value TLV71311PDBV
ki_keywords: LDO Regulator Fixed Positive; ki_description: 150mA Low Dropout Voltage Regulator, Fixed Output 1.1V, SOT-23-5; ki_fp_filters: SOT?23*; Footprint: Package_TO_SOT_SMD:SOT-23-5; Supplier: http://www.ti.com/lit/ds/symlink/tlv713p.pdf
footprint SOT-23-5
pins: 1 IN (power), 2 GND (power), 3 EN (in), 4 NC (in) hidden, 5 OUT (power)

## TLV71312PDBV
designator *  value TLV71312PDBV
ki_keywords: LDO Regulator Fixed Positive; ki_description: 150mA Low Dropout Voltage Regulator, Fixed Output 1.2V, SOT-23-5; ki_fp_filters: SOT?23*; Footprint: Package_TO_SOT_SMD:SOT-23-5; Supplier: http://www.ti.com/lit/ds/symlink/tlv713p.pdf
footprint SOT-23-5
pins: 1 IN (power), 2 GND (power), 3 EN (in), 4 NC (in) hidden, 5 OUT (power)

## TLV71315PDBV
designator *  value TLV71315PDBV
ki_keywords: LDO Regulator Fixed Positive; ki_description: 150mA Low Dropout Voltage Regulator, Fixed Output 1.5V, SOT-23-5; ki_fp_filters: SOT?23*; Footprint: Package_TO_SOT_SMD:SOT-23-5; Supplier: http://www.ti.com/lit/ds/symlink/tlv713p.pdf
footprint SOT-23-5
pins: 1 IN (power), 2 GND (power), 3 EN (in), 4 NC (in) hidden, 5 OUT (power)

## TLV71318PDBV
designator *  value TLV71318PDBV
ki_keywords: LDO Regulator Fixed Positive; ki_description: 150mA Low Dropout Voltage Regulator, Fixed Output 1.8V, SOT-23-5; ki_fp_filters: SOT?23*; Footprint: Package_TO_SOT_SMD:SOT-23-5; Supplier: http://www.ti.com/lit/ds/symlink/tlv713p.pdf
footprint SOT-23-5
pins: 1 IN (power), 2 GND (power), 3 EN (in), 4 NC (in) hidden, 5 OUT (power)

## TLV71325PDBV
designator *  value TLV71325PDBV
ki_keywords: LDO Regulator Fixed Positive; ki_description: 150mA Low Dropout Voltage Regulator, Fixed Output 2.5V, SOT-23-5; ki_fp_filters: SOT?23*; Footprint: Package_TO_SOT_SMD:SOT-23-5; Supplier: http://www.ti.com/lit/ds/symlink/tlv713p.pdf
footprint SOT-23-5
pins: 1 IN (power), 2 GND (power), 3 EN (in), 4 NC (in) hidden, 5 OUT (power)

## TLV71328PDBV
designator *  value TLV71328PDBV
ki_keywords: LDO Regulator Fixed Positive; ki_description: 150mA Low Dropout Voltage Regulator, Fixed Output 2.8V, SOT-23-5; ki_fp_filters: SOT?23*; Footprint: Package_TO_SOT_SMD:SOT-23-5; Supplier: http://www.ti.com/lit/ds/symlink/tlv713p.pdf
footprint SOT-23-5
pins: 1 IN (power), 2 GND (power), 3 EN (in), 4 NC (in) hidden, 5 OUT (power)

## TLV71330PDBV
designator *  value TLV71330PDBV
ki_keywords: LDO Regulator Fixed Positive; ki_description: 150mA Low Dropout Voltage Regulator, Fixed Output 3.0V, SOT-23-5; ki_fp_filters: SOT?23*; Footprint: Package_TO_SOT_SMD:SOT-23-5; Supplier: http://www.ti.com/lit/ds/symlink/tlv713p.pdf
footprint SOT-23-5
pins: 1 IN (power), 2 GND (power), 3 EN (in), 4 NC (in) hidden, 5 OUT (power)

## TLV71333PDBV
designator *  value TLV71333PDBV
ki_keywords: LDO Regulator Fixed Positive; ki_description: 150mA Low Dropout Voltage Regulator, Fixed Output 3.3V, SOT-23-5; ki_fp_filters: SOT?23*; Footprint: Package_TO_SOT_SMD:SOT-23-5; Supplier: http://www.ti.com/lit/ds/symlink/tlv713p.pdf
footprint SOT-23-5
pins: 1 IN (power), 2 GND (power), 3 EN (in), 4 NC (in) hidden, 5 OUT (power)

## TLV73310PDBV
designator *  value TLV73310PDBV
ki_keywords: 300mA LDO Regulator Fixed Positive Capacitor-Free; ki_description: 300mA Capacitor-Free Low Dropout Voltage Regulator, Fixed Output 1.0V, SOT-23-5; ki_fp_filters: SOT?23*; Footprint: Package_TO_SOT_SMD:SOT-23-5; Supplier: http://www.ti.com/lit/ds/symlink/tlv733p.pdf
footprint SOT-23-5
pins: 1 IN (power), 2 GND (power), 3 EN (in), 4 NC (in) hidden, 5 OUT (power)

## TLV73311PDBV
designator *  value TLV73311PDBV
ki_keywords: 300mA LDO Regulator Fixed Positive Capacitor-Free; ki_description: 300mA Capacitor-Free Low Dropout Voltage Regulator, Fixed Output 1.1V, SOT-23-5; ki_fp_filters: SOT?23*; Footprint: Package_TO_SOT_SMD:SOT-23-5; Supplier: http://www.ti.com/lit/ds/symlink/tlv733p.pdf
footprint SOT-23-5
pins: 1 IN (power), 2 GND (power), 3 EN (in), 4 NC (in) hidden, 5 OUT (power)

## TLV73312PDBV
designator *  value TLV73312PDBV
ki_keywords: 300mA LDO Regulator Fixed Positive Capacitor-Free; ki_description: 300mA Capacitor-Free Low Dropout Voltage Regulator, Fixed Output 1.2V, SOT-23-5; ki_fp_filters: SOT?23*; Footprint: Package_TO_SOT_SMD:SOT-23-5; Supplier: http://www.ti.com/lit/ds/symlink/tlv733p.pdf
footprint SOT-23-5
pins: 1 IN (power), 2 GND (power), 3 EN (in), 4 NC (in) hidden, 5 OUT (power)

## TLV73315PDBV
designator *  value TLV73315PDBV
ki_keywords: 300mA LDO Regulator Fixed Positive Capacitor-Free; ki_description: 300mA Capacitor-Free Low Dropout Voltage Regulator, Fixed Output 1.5V, SOT-23-5; ki_fp_filters: SOT?23*; Footprint: Package_TO_SOT_SMD:SOT-23-5; Supplier: http://www.ti.com/lit/ds/symlink/tlv733p.pdf
footprint SOT-23-5
pins: 1 IN (power), 2 GND (power), 3 EN (in), 4 NC (in) hidden, 5 OUT (power)